# Altium schematic symbol library WR-TBL_Pluggable PCB Header.SchLib: 719 symbols (part 5 of 5)
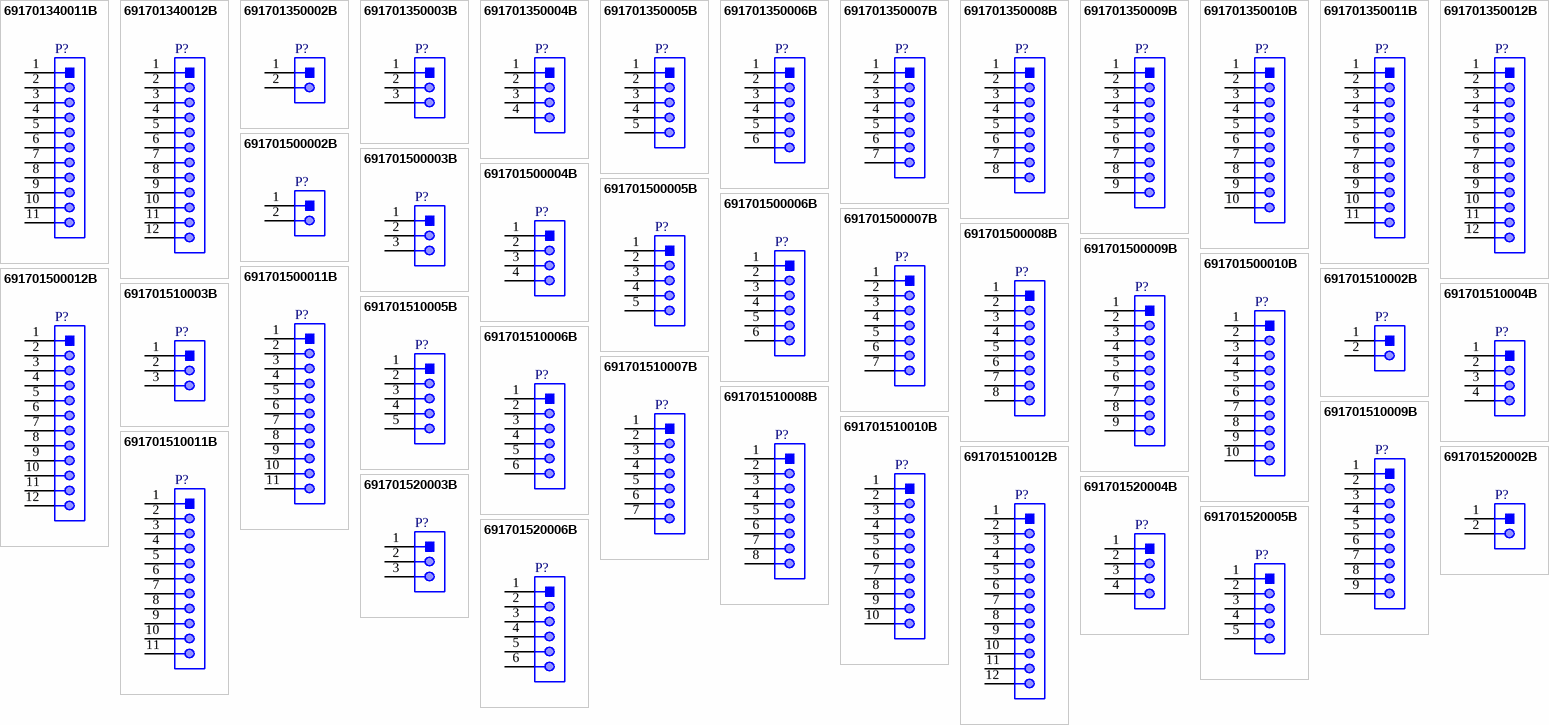
[diagram p21: symbols 691701340011B to 691701520006B]

## 691701510003B
designator P?
WR-TBL Serie 7015B Close Vertical PCB Header THR Type, Pluggable, pitch 5.08mm, 3p; Part Number: 691701510003B; Compliance: RoHS; Modularity: No; Pin Number: 3; Rated Current [UL]: 10A; Working Voltage [UL]: 300VAC; ComponentLink1Description: Manufacturer; ComponentLink1URL: http://www.we-online.de; ComponentLink2URL: https://katalog.we-online.de/em/datasheet/691701510003B.pdf; ComponentLink2Description: Datasheet; Mounting Technology: THR; Packaging: Box; Operating Temperature: -40 to +105degC; PCB/Cable/Panel: PCB; Pitch: 5.08mm; Published Date: October 2019; Type: Vertical; Publisher: Wurth Elektronik; Application: Pluggable
footprint 691701510003B
pins: 1, 2, 3

## 691701510004B
designator P?
WR-TBL Serie 7015B Close Vertical PCB Header THR Type, Pluggable, pitch 5.08mm, 4p; Part Number: 691701510004B; Compliance: RoHS; Modularity: No; Pin Number: 4; Rated Current [UL]: 10A; Working Voltage [UL]: 300VAC; ComponentLink1Description: Manufacturer; ComponentLink1URL: http://www.we-online.de; ComponentLink2URL: https://katalog.we-online.de/em/datasheet/691701510004B.pdf; ComponentLink2Description: Datasheet; Mounting Technology: THR; Packaging: Box; Operating Temperature: -40 to +105degC; PCB/Cable/Panel: PCB; Pitch: 5.08mm; Published Date: October 2019; Type: Vertical; Publisher: Wurth Elektronik; Application: Pluggable
footprint 691701510004B
pins: 1, 2, 3, 4

## 691701510005B
designator P?
WR-TBL Serie 7015B Close Vertical PCB Header THR Type, Pluggable, pitch 5.08mm, 5p; Part Number: 691701510005B; Compliance: RoHS; Modularity: No; Pin Number: 5; Rated Current [UL]: 10A; Working Voltage [UL]: 300VAC; ComponentLink1Description: Manufacturer; ComponentLink1URL: http://www.we-online.de; ComponentLink2URL: https://katalog.we-online.de/em/datasheet/691701510005B.pdf; ComponentLink2Description: Datasheet; Mounting Technology: THR; Packaging: Box; Operating Temperature: -40 to +105degC; PCB/Cable/Panel: PCB; Pitch: 5.08mm; Published Date: October 2019; Type: Vertical; Publisher: Wurth Elektronik; Application: Pluggable
footprint 691701510005B
pins: 1, 2, 3, 4, 5

## 691701510006B
designator P?
WR-TBL Serie 7015B Close Vertical PCB Header THR Type, Pluggable, pitch 5.08mm, 6p; Part Number: 691701510006B; Compliance: RoHS; Modularity: No; Pin Number: 6; Rated Current [UL]: 10A; Working Voltage [UL]: 300VAC; ComponentLink1Description: Manufacturer; ComponentLink1URL: http://www.we-online.de; ComponentLink2URL: https://katalog.we-online.de/em/datasheet/691701510006B.pdf; ComponentLink2Description: Datasheet; Mounting Technology: THR; Packaging: Box; Operating Temperature: -40 to +105degC; PCB/Cable/Panel: PCB; Pitch: 5.08mm; Published Date: October 2019; Type: Vertical; Publisher: Wurth Elektronik; Application: Pluggable
footprint 691701510006B
pins: 1, 2, 3, 4, 5, 6

## 691701510007B
designator P?
WR-TBL Serie 7015B Close Vertical PCB Header THR Type, Pluggable, pitch 5.08mm, 7p; Part Number: 691701510007B; Compliance: RoHS; Modularity: No; Pin Number: 7; Rated Current [UL]: 10A; Working Voltage [UL]: 300VAC; ComponentLink1Description: Manufacturer; ComponentLink1URL: http://www.we-online.de; ComponentLink2URL: https://katalog.we-online.de/em/datasheet/691701510007B.pdf; ComponentLink2Description: Datasheet; Mounting Technology: THR; Packaging: Box; Operating Temperature: -40 to +105degC; PCB/Cable/Panel: PCB; Pitch: 5.08mm; Published Date: October 2019; Type: Vertical; Publisher: Wurth Elektronik; Application: Pluggable
footprint 691701510007B
pins: 1, 2, 3, 4, 5, 6, 7

## 691701510008B
designator P?
WR-TBL Serie 7015B Close Vertical PCB Header THR Type, Pluggable, pitch 5.08mm, 8p; Part Number: 691701510008B; Compliance: RoHS; Modularity: No; Pin Number: 8; Rated Current [UL]: 10A; Working Voltage [UL]: 300VAC; ComponentLink1Description: Manufacturer; ComponentLink1URL: http://www.we-online.de; ComponentLink2URL: https://katalog.we-online.de/em/datasheet/691701510008B.pdf; ComponentLink2Description: Datasheet; Mounting Technology: THR; Packaging: Box; Operating Temperature: -40 to +105degC; PCB/Cable/Panel: PCB; Pitch: 5.08mm; Published Date: October 2019; Type: Vertical; Publisher: Wurth Elektronik; Application: Pluggable
footprint 691701510008B
pins: 1, 2, 3, 4, 5, 6, 7, 8

## 691701510009B
designator P?
WR-TBL Serie 7015B Close Vertical PCB Header THR Type, Pluggable, pitch 5.08mm, 9p; Part Number: 691701510009B; Compliance: RoHS; Modularity: No; Pin Number: 9; Rated Current [UL]: 10A; Working Voltage [UL]: 300VAC; ComponentLink1Description: Manufacturer; ComponentLink1URL: http://www.we-online.de; ComponentLink2URL: https://katalog.we-online.de/em/datasheet/691701510009B.pdf; ComponentLink2Description: Datasheet; Mounting Technology: THR; Packaging: Box; Operating Temperature: -40 to +105degC; PCB/Cable/Panel: PCB; Pitch: 5.08mm; Published Date: October 2019; Type: Vertical; Publisher: Wurth Elektronik; Application: Pluggable
footprint 691701510009B
pins: 1, 2, 3, 4, 5, 6, 7, 8, 9

## 691701510010B
designator P?
WR-TBL Serie 7015B Close Vertical PCB Header THR Type, Pluggable, pitch 5.08mm, 10p; Part Number: 691701510010B; Compliance: RoHS; Modularity: No; Pin Number: 10; Rated Current [UL]: 10A; Working Voltage [UL]: 300VAC; ComponentLink1Description: Manufacturer; ComponentLink1URL: http://www.we-online.de; ComponentLink2URL: https://katalog.we-online.de/em/datasheet/691701510010B.pdf; ComponentLink2Description: Datasheet; Mounting Technology: THR; Packaging: Box; Operating Temperature: -40 to +105degC; PCB/Cable/Panel: PCB; Pitch: 5.08mm; Published Date: October 2019; Type: Vertical; Publisher: Wurth Elektronik; Application: Pluggable
footprint 691701510010B
pins: 1, 2, 3, 4, 5, 6, 7, 8, 9, 10

## 691701510011B
designator P?
WR-TBL Serie 7015B Close Vertical PCB Header THR Type, Pluggable, pitch 5.08mm, 11p; Part Number: 691701510011B; Compliance: RoHS; Modularity: No; Pin Number: 11; Rated Current [UL]: 10A; Working Voltage [UL]: 300VAC; ComponentLink1Description: Manufacturer; ComponentLink1URL: http://www.we-online.de; ComponentLink2URL: https://katalog.we-online.de/em/datasheet/691701510011B.pdf; ComponentLink2Description: Datasheet; Mounting Technology: THR; Packaging: Box; Operating Temperature: -40 to +105degC; PCB/Cable/Panel: PCB; Pitch: 5.08mm; Published Date: October 2019; Type: Vertical; Publisher: Wurth Elektronik; Application: Pluggable
footprint 691701510011B
pins: 1, 2, 3, 4, 5, 6, 7, 8, 9, 10, 11

## 691701510012B
designator P?
WR-TBL Serie 7015B Close Vertical PCB Header THR Type, Pluggable, pitch 5.08mm, 12p; Part Number: 691701510012B; Compliance: RoHS; Modularity: No; Pin Number: 12; Rated Current [UL]: 10A; Working Voltage [UL]: 300VAC; ComponentLink1Description: Manufacturer; ComponentLink1URL: http://www.we-online.de; ComponentLink2URL: https://katalog.we-online.de/em/datasheet/691701510012B.pdf; ComponentLink2Description: Datasheet; Mounting Technology: THR; Packaging: Box; Operating Temperature: -40 to +105degC; PCB/Cable/Panel: PCB; Pitch: 5.08mm; Published Date: October 2019; Type: Vertical; Publisher: Wurth Elektronik; Application: Pluggable
footprint 691701510012B
pins: 1, 2, 3, 4, 5, 6, 7, 8, 9, 10, 11, 12

## 691701520002B
designator P?
WR-TBL Serie 7015B Close Vertical PCB Header THR Type with Flanges, Pluggable, pitch 5.08mm, 2p; Part Number: 691701520002B; Compliance: RoHS; Modularity: No; Pin Number: 2; Rated Current [UL]: 10A; Working Voltage [UL]: 300VAC; ComponentLink1Description: Manufacturer; ComponentLink1URL: http://www.we-online.de; ComponentLink2URL: https://katalog.we-online.de/em/datasheet/691701520002B.pdf; ComponentLink2Description: Datasheet; Mounting Technology: THR; Packaging: Box; Operating Temperature: -40 to +105degC; PCB/Cable/Panel: PCB; Pitch: 5.08mm; Published Date: October 2019; Type: Vertical; Publisher: Wurth Elektronik; Application: Pluggable
footprint 691701520002B
pins: 1, 2

## 691701520003B
designator P?
WR-TBL Serie 7015B Close Vertical PCB Header THR Type with Flanges, Pluggable, pitch 5.08mm, 3p; Part Number: 691701520003B; Compliance: RoHS; Modularity: No; Pin Number: 3; Rated Current [UL]: 10A; Working Voltage [UL]: 300VAC; ComponentLink1Description: Manufacturer; ComponentLink1URL: http://www.we-online.de; ComponentLink2URL: https://katalog.we-online.de/em/datasheet/691701520003B.pdf; ComponentLink2Description: Datasheet; Mounting Technology: THR; Packaging: Box; Operating Temperature: -40 to +105degC; PCB/Cable/Panel: PCB; Pitch: 5.08mm; Published Date: October 2019; Type: Vertical; Publisher: Wurth Elektronik; Application: Pluggable
footprint 691701520003B
pins: 1, 2, 3

## 691701520004B
designator P?
WR-TBL Serie 7015B Close Vertical PCB Header THR Type with Flanges, Pluggable, pitch 5.08mm, 4p; Part Number: 691701520004B; Compliance: RoHS; Modularity: No; Pin Number: 4; Rated Current [UL]: 10A; Working Voltage [UL]: 300VAC; ComponentLink1Description: Manufacturer; ComponentLink1URL: http://www.we-online.de; ComponentLink2URL: https://katalog.we-online.de/em/datasheet/691701520004B.pdf; ComponentLink2Description: Datasheet; Mounting Technology: THR; Packaging: Box; Operating Temperature: -40 to +105degC; PCB/Cable/Panel: PCB; Pitch: 5.08mm; Published Date: October 2019; Type: Vertical; Publisher: Wurth Elektronik; Application: Pluggable
footprint 691701520004B
pins: 1, 2, 3, 4

## 691701520005B
designator P?
WR-TBL Serie 7015B Close Vertical PCB Header THR Type with Flanges, Pluggable, pitch 5.08mm, 5p; Part Number: 691701520005B; Compliance: RoHS; Modularity: No; Pin Number: 5; Rated Current [UL]: 10A; Working Voltage [UL]: 300VAC; ComponentLink1Description: Manufacturer; ComponentLink1URL: http://www.we-online.de; ComponentLink2URL: https://katalog.we-online.de/em/datasheet/691701520005B.pdf; ComponentLink2Description: Datasheet; Mounting Technology: THR; Packaging: Box; Operating Temperature: -40 to +105degC; PCB/Cable/Panel: PCB; Pitch: 5.08mm; Published Date: October 2019; Type: Vertical; Publisher: Wurth Elektronik; Application: Pluggable
footprint 691701520005B
pins: 1, 2, 3, 4, 5

## 691701520006B
designator P?
WR-TBL Serie 7015B Close Vertical PCB Header THR Type with Flanges, Pluggable, pitch 5.08mm, 6p; Part Number: 691701520006B; Compliance: RoHS; Modularity: No; Pin Number: 6; Rated Current [UL]: 10A; Working Voltage [UL]: 300VAC; ComponentLink1Description: Manufacturer; ComponentLink1URL: http://www.we-online.de; ComponentLink2URL: https://katalog.we-online.de/em/datasheet/691701520006B.pdf; ComponentLink2Description: Datasheet; Mounting Technology: THR; Packaging: Box; Operating Temperature: -40 to +105degC; PCB/Cable/Panel: PCB; Pitch: 5.08mm; Published Date: October 2019; Type: Vertical; Publisher: Wurth Elektronik; Application: Pluggable
footprint 691701520006B
pins: 1, 2, 3, 4, 5, 6

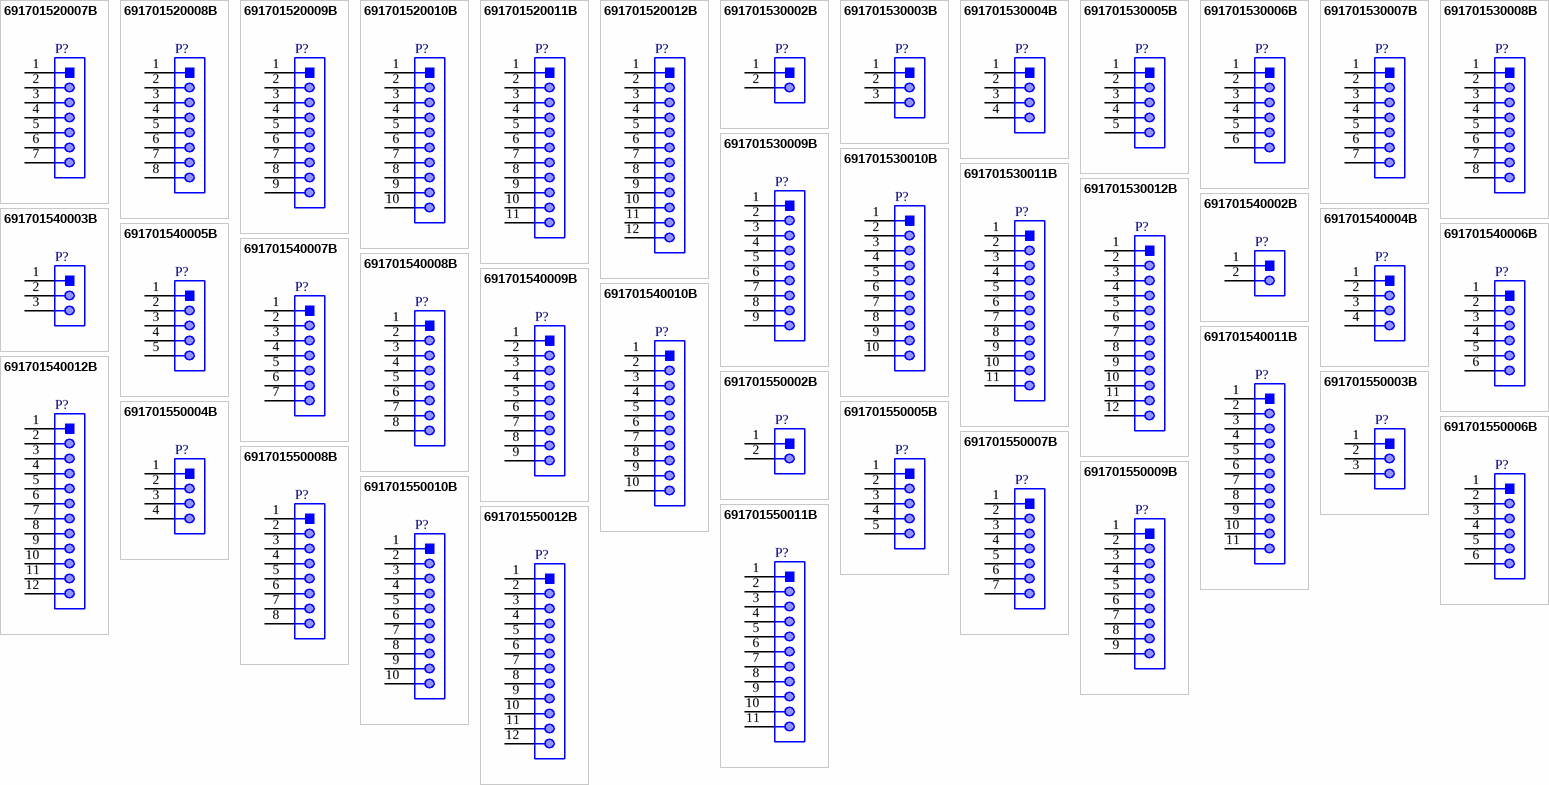
[diagram p17: symbols 691701520007B to 691701550012B]

## 691701520007B
designator P?
WR-TBL Serie 7015B Close Vertical PCB Header THR Type with Flanges, Pluggable, pitch 5.08mm, 7p; Part Number: 691701520007B; Compliance: RoHS; Modularity: No; Pin Number: 7; Rated Current [UL]: 10A; Working Voltage [UL]: 300VAC; ComponentLink1Description: Manufacturer; ComponentLink1URL: http://www.we-online.de; ComponentLink2URL: https://katalog.we-online.de/em/datasheet/691701520007B.pdf; ComponentLink2Description: Datasheet; Mounting Technology: THR; Packaging: Box; Operating Temperature: -40 to +105degC; PCB/Cable/Panel: PCB; Pitch: 5.08mm; Published Date: October 2019; Type: Vertical; Publisher: Wurth Elektronik; Application: Pluggable
footprint 691701520007B
pins: 1, 2, 3, 4, 5, 6, 7

## 691701520008B
designator P?
WR-TBL Serie 7015B Close Vertical PCB Header THR Type with Flanges, Pluggable, pitch 5.08mm, 8p; Part Number: 691701520008B; Compliance: RoHS; Modularity: No; Pin Number: 8; Rated Current [UL]: 10A; Working Voltage [UL]: 300VAC; ComponentLink1Description: Manufacturer; ComponentLink1URL: http://www.we-online.de; ComponentLink2URL: https://katalog.we-online.de/em/datasheet/691701520008B.pdf; ComponentLink2Description: Datasheet; Mounting Technology: THR; Packaging: Box; Operating Temperature: -40 to +105degC; PCB/Cable/Panel: PCB; Pitch: 5.08mm; Published Date: October 2019; Type: Vertical; Publisher: Wurth Elektronik; Application: Pluggable
footprint 691701520008B
pins: 1, 2, 3, 4, 5, 6, 7, 8

## 691701520009B
designator P?
WR-TBL Serie 7015B Close Vertical PCB Header THR Type with Flanges, Pluggable, pitch 5.08mm, 9p; Part Number: 691701520009B; Compliance: RoHS; Modularity: No; Pin Number: 9; Rated Current [UL]: 10A; Working Voltage [UL]: 300VAC; ComponentLink1Description: Manufacturer; ComponentLink1URL: http://www.we-online.de; ComponentLink2URL: https://katalog.we-online.de/em/datasheet/691701520009B.pdf; ComponentLink2Description: Datasheet; Mounting Technology: THR; Packaging: Box; Operating Temperature: -40 to +105degC; PCB/Cable/Panel: PCB; Pitch: 5.08mm; Published Date: October 2019; Type: Vertical; Publisher: Wurth Elektronik; Application: Pluggable
footprint 691701520009B
pins: 1, 2, 3, 4, 5, 6, 7, 8, 9

## 691701520010B
designator P?
WR-TBL Serie 7015B Close Vertical PCB Header THR Type with Flanges, Pluggable, pitch 5.08mm, 10p; Part Number: 691701520010B; Compliance: RoHS; Modularity: No; Pin Number: 10; Rated Current [UL]: 10A; Working Voltage [UL]: 300VAC; ComponentLink1Description: Manufacturer; ComponentLink1URL: http://www.we-online.de; ComponentLink2URL: https://katalog.we-online.de/em/datasheet/691701520010B.pdf; ComponentLink2Description: Datasheet; Mounting Technology: THR; Packaging: Box; Operating Temperature: -40 to +105degC; PCB/Cable/Panel: PCB; Pitch: 5.08mm; Published Date: October 2019; Type: Vertical; Publisher: Wurth Elektronik; Application: Pluggable
footprint 691701520010B
pins: 1, 2, 3, 4, 5, 6, 7, 8, 9, 10

## 691701520011B
designator P?
WR-TBL Serie 7015B Close Vertical PCB Header THR Type with Flanges, Pluggable, pitch 5.08mm, 11p; Part Number: 691701520011B; Compliance: RoHS; Modularity: No; Pin Number: 11; Rated Current [UL]: 10A; Working Voltage [UL]: 300VAC; ComponentLink1Description: Manufacturer; ComponentLink1URL: http://www.we-online.de; ComponentLink2URL: https://katalog.we-online.de/em/datasheet/691701520011B.pdf; ComponentLink2Description: Datasheet; Mounting Technology: THR; Packaging: Box; Operating Temperature: -40 to +105degC; PCB/Cable/Panel: PCB; Pitch: 5.08mm; Published Date: October 2019; Type: Vertical; Publisher: Wurth Elektronik; Application: Pluggable
footprint 691701520011B
pins: 1, 2, 3, 4, 5, 6, 7, 8, 9, 10, 11

## 691701520012B
designator P?
WR-TBL Serie 7015B Close Vertical PCB Header THR Type with Flanges, Pluggable, pitch 5.08mm, 12p; Part Number: 691701520012B; Compliance: RoHS; Modularity: No; Pin Number: 12; Rated Current [UL]: 10A; Working Voltage [UL]: 300VAC; ComponentLink1Description: Manufacturer; ComponentLink1URL: http://www.we-online.de; ComponentLink2URL: https://katalog.we-online.de/em/datasheet/691701520012B.pdf; ComponentLink2Description: Datasheet; Mounting Technology: THR; Packaging: Box; Operating Temperature: -40 to +105degC; PCB/Cable/Panel: PCB; Pitch: 5.08mm; Published Date: October 2019; Type: Vertical; Publisher: Wurth Elektronik; Application: Pluggable
footprint 691701520012B
pins: 1, 2, 3, 4, 5, 6, 7, 8, 9, 10, 11, 12

## 691701530002B
designator P?
WR-TBL Serie 7015B Open Horizontal PCB Header THR Type, Pluggable, pitch 5.08mm, 2p; Part Number: 691701530002B; Compliance: RoHS; Modularity: No; Pin Number: 2; Rated Current [UL]: 10A; Working Voltage [UL]: 300VAC; ComponentLink1Description: Manufacturer; ComponentLink1URL: http://www.we-online.de; ComponentLink2URL: https://katalog.we-online.de/em/datasheet/691701530002B.pdf; ComponentLink2Description: Datasheet; Mounting Technology: THR; Packaging: Box; Operating Temperature: -40 to +105degC; PCB/Cable/Panel: PCB; Pitch: 5.08mm; Published Date: October 2019; Type: Horizontal; Publisher: Wurth Elektronik; Application: Pluggable
footprint 691701530002B
pins: 1, 2

## 691701530003B
designator P?
WR-TBL Serie 7015B Open Horizontal PCB Header THR Type, Pluggable, pitch 5.08mm, 3p; Part Number: 691701530003B; Compliance: RoHS; Modularity: No; Pin Number: 3; Rated Current [UL]: 10A; Working Voltage [UL]: 300VAC; ComponentLink1Description: Manufacturer; ComponentLink1URL: http://www.we-online.de; ComponentLink2URL: https://katalog.we-online.de/em/datasheet/691701530003B.pdf; ComponentLink2Description: Datasheet; Mounting Technology: THR; Packaging: Box; Operating Temperature: -40 to +105degC; PCB/Cable/Panel: PCB; Pitch: 5.08mm; Published Date: October 2019; Type: Horizontal; Publisher: Wurth Elektronik; Application: Pluggable
footprint 691701530003B
pins: 1, 2, 3

## 691701530004B
designator P?
WR-TBL Serie 7015B Open Horizontal PCB Header THR Type, Pluggable, pitch 5.08mm, 4p; Part Number: 691701530004B; Compliance: RoHS; Modularity: No; Pin Number: 4; Rated Current [UL]: 10A; Working Voltage [UL]: 300VAC; ComponentLink1Description: Manufacturer; ComponentLink1URL: http://www.we-online.de; ComponentLink2URL: https://katalog.we-online.de/em/datasheet/691701530004B.pdf; ComponentLink2Description: Datasheet; Mounting Technology: THR; Packaging: Box; Operating Temperature: -40 to +105degC; PCB/Cable/Panel: PCB; Pitch: 5.08mm; Published Date: October 2019; Type: Horizontal; Publisher: Wurth Elektronik; Application: Pluggable
footprint 691701530004B
pins: 1, 2, 3, 4

## 691701530005B
designator P?
WR-TBL Serie 7015B Open Horizontal PCB Header THR Type, Pluggable, pitch 5.08mm, 5p; Part Number: 691701530005B; Compliance: RoHS; Modularity: No; Pin Number: 5; Rated Current [UL]: 10A; Working Voltage [UL]: 300VAC; ComponentLink1Description: Manufacturer; ComponentLink1URL: http://www.we-online.de; ComponentLink2URL: https://katalog.we-online.de/em/datasheet/691701530005B.pdf; ComponentLink2Description: Datasheet; Mounting Technology: THR; Packaging: Box; Operating Temperature: -40 to +105degC; PCB/Cable/Panel: PCB; Pitch: 5.08mm; Published Date: October 2019; Type: Horizontal; Publisher: Wurth Elektronik; Application: Pluggable
footprint 691701530005B
pins: 1, 2, 3, 4, 5

## 691701530006B
designator P?
WR-TBL Serie 7015B Open Horizontal PCB Header THR Type, Pluggable, pitch 5.08mm, 6p; Part Number: 691701530006B; Compliance: RoHS; Modularity: No; Pin Number: 6; Rated Current [UL]: 10A; Working Voltage [UL]: 300VAC; ComponentLink1Description: Manufacturer; ComponentLink1URL: http://www.we-online.de; ComponentLink2URL: https://katalog.we-online.de/em/datasheet/691701530006B.pdf; ComponentLink2Description: Datasheet; Mounting Technology: THR; Packaging: Box; Operating Temperature: -40 to +105degC; PCB/Cable/Panel: PCB; Pitch: 5.08mm; Published Date: October 2019; Type: Horizontal; Publisher: Wurth Elektronik; Application: Pluggable
footprint 691701530006B
pins: 1, 2, 3, 4, 5, 6

## 691701530007B
designator P?
WR-TBL Serie 7015B Open Horizontal PCB Header THR Type, Pluggable, pitch 5.08mm, 7p; Part Number: 691701530007B; Compliance: RoHS; Modularity: No; Pin Number: 7; Rated Current [UL]: 10A; Working Voltage [UL]: 300VAC; ComponentLink1Description: Manufacturer; ComponentLink1URL: http://www.we-online.de; ComponentLink2URL: https://katalog.we-online.de/em/datasheet/691701530007B.pdf; ComponentLink2Description: Datasheet; Mounting Technology: THR; Packaging: Box; Operating Temperature: -40 to +105degC; PCB/Cable/Panel: PCB; Pitch: 5.08mm; Published Date: October 2019; Type: Horizontal; Publisher: Wurth Elektronik; Application: Pluggable
footprint 691701530007B
pins: 1, 2, 3, 4, 5, 6, 7

## 691701530008B
designator P?
WR-TBL Serie 7015B Open Horizontal PCB Header THR Type, Pluggable, pitch 5.08mm, 8p; Part Number: 691701530008B; Compliance: RoHS; Modularity: No; Pin Number: 8; Rated Current [UL]: 10A; Working Voltage [UL]: 300VAC; ComponentLink1Description: Manufacturer; ComponentLink1URL: http://www.we-online.de; ComponentLink2URL: https://katalog.we-online.de/em/datasheet/691701530008B.pdf; ComponentLink2Description: Datasheet; Mounting Technology: THR; Packaging: Box; Operating Temperature: -40 to +105degC; PCB/Cable/Panel: PCB; Pitch: 5.08mm; Published Date: October 2019; Type: Horizontal; Publisher: Wurth Elektronik; Application: Pluggable
footprint 691701530008B
pins: 1, 2, 3, 4, 5, 6, 7, 8

## 691701530009B
designator P?
WR-TBL Serie 7015B Open Horizontal PCB Header THR Type, Pluggable, pitch 5.08mm, 9p; Part Number: 691701530009B; Compliance: RoHS; Modularity: No; Pin Number: 9; Rated Current [UL]: 10A; Working Voltage [UL]: 300VAC; ComponentLink1Description: Manufacturer; ComponentLink1URL: http://www.we-online.de; ComponentLink2URL: https://katalog.we-online.de/em/datasheet/691701530009B.pdf; ComponentLink2Description: Datasheet; Mounting Technology: THR; Packaging: Box; Operating Temperature: -40 to +105degC; PCB/Cable/Panel: PCB; Pitch: 5.08mm; Published Date: October 2019; Type: Horizontal; Publisher: Wurth Elektronik; Application: Pluggable
footprint 691701530009B
pins: 1, 2, 3, 4, 5, 6, 7, 8, 9

## 691701530010B
designator P?
WR-TBL Serie 7015B Open Horizontal PCB Header THR Type, Pluggable, pitch 5.08mm, 10p; Part Number: 691701530010B; Compliance: RoHS; Modularity: No; Pin Number: 10; Rated Current [UL]: 10A; Working Voltage [UL]: 300VAC; ComponentLink1Description: Manufacturer; ComponentLink1URL: http://www.we-online.de; ComponentLink2URL: https://katalog.we-online.de/em/datasheet/691701530010B.pdf; ComponentLink2Description: Datasheet; Mounting Technology: THR; Packaging: Box; Operating Temperature: -40 to +105degC; PCB/Cable/Panel: PCB; Pitch: 5.08mm; Published Date: October 2019; Type: Horizontal; Publisher: Wurth Elektronik; Application: Pluggable
footprint 691701530010B
pins: 1, 2, 3, 4, 5, 6, 7, 8, 9, 10

## 691701530011B
designator P?
WR-TBL Serie 7015B Open Horizontal PCB Header THR Type, Pluggable, pitch 5.08mm, 11p; Part Number: 691701530011B; Compliance: RoHS; Modularity: No; Pin Number: 11; Rated Current [UL]: 10A; Working Voltage [UL]: 300VAC; ComponentLink1Description: Manufacturer; ComponentLink1URL: http://www.we-online.de; ComponentLink2URL: https://katalog.we-online.de/em/datasheet/691701530011B.pdf; ComponentLink2Description: Datasheet; Mounting Technology: THR; Packaging: Box; Operating Temperature: -40 to +105degC; PCB/Cable/Panel: PCB; Pitch: 5.08mm; Published Date: October 2019; Type: Horizontal; Publisher: Wurth Elektronik; Application: Pluggable
footprint 691701530011B
pins: 1, 2, 3, 4, 5, 6, 7, 8, 9, 10, 11

## 691701530012B
designator P?
WR-TBL Serie 7015B Open Horizontal PCB Header THR Type, Pluggable, pitch 5.08mm, 12p; Part Number: 691701530012B; Compliance: RoHS; Modularity: No; Pin Number: 12; Rated Current [UL]: 10A; Working Voltage [UL]: 300VAC; ComponentLink1Description: Manufacturer; ComponentLink1URL: http://www.we-online.de; ComponentLink2URL: https://katalog.we-online.de/em/datasheet/691701530012B.pdf; ComponentLink2Description: Datasheet; Mounting Technology: THR; Packaging: Box; Operating Temperature: -40 to +105degC; PCB/Cable/Panel: PCB; Pitch: 5.08mm; Published Date: October 2019; Type: Horizontal; Publisher: Wurth Elektronik; Application: Pluggable
footprint 691701530012B
pins: 1, 2, 3, 4, 5, 6, 7, 8, 9, 10, 11, 12

## 691701540002B
designator P?
WR-TBL Serie 7015B Close Horizontal PCB Header THR Type, Pluggable, pitch 5.08mm, 2p; Part Number: 691701540002B; Compliance: RoHS; Modularity: No; Pin Number: 2; Rated Current [UL]: 10A; Working Voltage [UL]: 300VAC; ComponentLink1Description: Manufacturer; ComponentLink1URL: http://www.we-online.de; ComponentLink2URL: https://katalog.we-online.de/em/datasheet/691701540002B.pdf; ComponentLink2Description: Datasheet; Mounting Technology: THR; Packaging: Box; Operating Temperature: -40 to +105degC; PCB/Cable/Panel: PCB; Pitch: 5.08mm; Published Date: October 2019; Type: Horizontal; Publisher: Wurth Elektronik; Application: Pluggable
footprint 691701540002B
pins: 1, 2

## 691701540003B
designator P?
WR-TBL Serie 7015B Close Horizontal PCB Header THR Type, Pluggable, pitch 5.08mm, 3p; Part Number: 691701540003B; Compliance: RoHS; Modularity: No; Pin Number: 3; Rated Current [UL]: 10A; Working Voltage [UL]: 300VAC; ComponentLink1Description: Manufacturer; ComponentLink1URL: http://www.we-online.de; ComponentLink2URL: https://katalog.we-online.de/em/datasheet/691701540003B.pdf; ComponentLink2Description: Datasheet; Mounting Technology: THR; Packaging: Box; Operating Temperature: -40 to +105degC; PCB/Cable/Panel: PCB; Pitch: 5.08mm; Published Date: October 2019; Type: Horizontal; Publisher: Wurth Elektronik; Application: Pluggable
footprint 691701540003B
pins: 1, 2, 3

## 691701540004B
designator P?
WR-TBL Serie 7015B Close Horizontal PCB Header THR Type, Pluggable, pitch 5.08mm, 4p; Part Number: 691701540004B; Compliance: RoHS; Modularity: No; Pin Number: 4; Rated Current [UL]: 10A; Working Voltage [UL]: 300VAC; ComponentLink1Description: Manufacturer; ComponentLink1URL: http://www.we-online.de; ComponentLink2URL: https://katalog.we-online.de/em/datasheet/691701540004B.pdf; ComponentLink2Description: Datasheet; Mounting Technology: THR; Packaging: Box; Operating Temperature: -40 to +105degC; PCB/Cable/Panel: PCB; Pitch: 5.08mm; Published Date: October 2019; Type: Horizontal; Publisher: Wurth Elektronik; Application: Pluggable
footprint 691701540004B
pins: 1, 2, 3, 4

## 691701540005B
designator P?
WR-TBL Serie 7015B Close Horizontal PCB Header THR Type, Pluggable, pitch 5.08mm, 5p; Part Number: 691701540005B; Compliance: RoHS; Modularity: No; Pin Number: 5; Rated Current [UL]: 10A; Working Voltage [UL]: 300VAC; ComponentLink1Description: Manufacturer; ComponentLink1URL: http://www.we-online.de; ComponentLink2URL: https://katalog.we-online.de/em/datasheet/691701540005B.pdf; ComponentLink2Description: Datasheet; Mounting Technology: THR; Packaging: Box; Operating Temperature: -40 to +105degC; PCB/Cable/Panel: PCB; Pitch: 5.08mm; Published Date: October 2019; Type: Horizontal; Publisher: Wurth Elektronik; Application: Pluggable
footprint 691701540005B
pins: 1, 2, 3, 4, 5

## 691701540006B
designator P?
WR-TBL Serie 7015B Close Horizontal PCB Header THR Type, Pluggable, pitch 5.08mm, 6p; Part Number: 691701540006B; Compliance: RoHS; Modularity: No; Pin Number: 6; Rated Current [UL]: 10A; Working Voltage [UL]: 300VAC; ComponentLink1Description: Manufacturer; ComponentLink1URL: http://www.we-online.de; ComponentLink2URL: https://katalog.we-online.de/em/datasheet/691701540006B.pdf; ComponentLink2Description: Datasheet; Mounting Technology: THR; Packaging: Box; Operating Temperature: -40 to +105degC; PCB/Cable/Panel: PCB; Pitch: 5.08mm; Published Date: October 2019; Type: Horizontal; Publisher: Wurth Elektronik; Application: Pluggable
footprint 691701540006B
pins: 1, 2, 3, 4, 5, 6

## 691701540007B
designator P?
WR-TBL Serie 7015B Close Horizontal PCB Header THR Type, Pluggable, pitch 5.08mm, 7p; Part Number: 691701540007B; Compliance: RoHS; Modularity: No; Pin Number: 7; Rated Current [UL]: 10A; Working Voltage [UL]: 300VAC; ComponentLink1Description: Manufacturer; ComponentLink1URL: http://www.we-online.de; ComponentLink2URL: https://katalog.we-online.de/em/datasheet/691701540007B.pdf; ComponentLink2Description: Datasheet; Mounting Technology: THR; Packaging: Box; Operating Temperature: -40 to +105degC; PCB/Cable/Panel: PCB; Pitch: 5.08mm; Published Date: October 2019; Type: Horizontal; Publisher: Wurth Elektronik; Application: Pluggable
footprint 691701540007B
pins: 1, 2, 3, 4, 5, 6, 7

## 691701540008B
designator P?
WR-TBL Serie 7015B Close Horizontal PCB Header THR Type, Pluggable, pitch 5.08mm, 8p; Part Number: 691701540008B; Compliance: RoHS; Modularity: No; Pin Number: 8; Rated Current [UL]: 10A; Working Voltage [UL]: 300VAC; ComponentLink1Description: Manufacturer; ComponentLink1URL: http://www.we-online.de; ComponentLink2URL: https://katalog.we-online.de/em/datasheet/691701540008B.pdf; ComponentLink2Description: Datasheet; Mounting Technology: THR; Packaging: Box; Operating Temperature: -40 to +105degC; PCB/Cable/Panel: PCB; Pitch: 5.08mm; Published Date: October 2019; Type: Horizontal; Publisher: Wurth Elektronik; Application: Pluggable
footprint 691701540008B
pins: 1, 2, 3, 4, 5, 6, 7, 8

## 691701540009B
designator P?
WR-TBL Serie 7015B Close Horizontal PCB Header THR Type, Pluggable, pitch 5.08mm, 9p; Part Number: 691701540009B; Compliance: RoHS; Modularity: No; Pin Number: 9; Rated Current [UL]: 10A; Working Voltage [UL]: 300VAC; ComponentLink1Description: Manufacturer; ComponentLink1URL: http://www.we-online.de; ComponentLink2URL: https://katalog.we-online.de/em/datasheet/691701540009B.pdf; ComponentLink2Description: Datasheet; Mounting Technology: THR; Packaging: Box; Operating Temperature: -40 to +105degC; PCB/Cable/Panel: PCB; Pitch: 5.08mm; Published Date: October 2019; Type: Horizontal; Publisher: Wurth Elektronik; Application: Pluggable
footprint 691701540009B
pins: 1, 2, 3, 4, 5, 6, 7, 8, 9

## 691701540010B
designator P?
WR-TBL Serie 7015B Close Horizontal PCB Header THR Type, Pluggable, pitch 5.08mm, 10p; Part Number: 691701540010B; Compliance: RoHS; Modularity: No; Pin Number: 10; Rated Current [UL]: 10A; Working Voltage [UL]: 300VAC; ComponentLink1Description: Manufacturer; ComponentLink1URL: http://www.we-online.de; ComponentLink2URL: https://katalog.we-online.de/em/datasheet/691701540010B.pdf; ComponentLink2Description: Datasheet; Mounting Technology: THR; Packaging: Box; Operating Temperature: -40 to +105degC; PCB/Cable/Panel: PCB; Pitch: 5.08mm; Published Date: October 2019; Type: Horizontal; Publisher: Wurth Elektronik; Application: Pluggable
footprint 691701540010B
pins: 1, 2, 3, 4, 5, 6, 7, 8, 9, 10

## 691701540011B
designator P?
WR-TBL Serie 7015B Close Horizontal PCB Header THR Type, Pluggable, pitch 5.08mm, 11p; Part Number: 691701540011B; Compliance: RoHS; Modularity: No; Pin Number: 11; Rated Current [UL]: 10A; Working Voltage [UL]: 300VAC; ComponentLink1Description: Manufacturer; ComponentLink1URL: http://www.we-online.de; ComponentLink2URL: https://katalog.we-online.de/em/datasheet/691701540011B.pdf; ComponentLink2Description: Datasheet; Mounting Technology: THR; Packaging: Box; Operating Temperature: -40 to +105degC; PCB/Cable/Panel: PCB; Pitch: 5.08mm; Published Date: October 2019; Type: Horizontal; Publisher: Wurth Elektronik; Application: Pluggable
footprint 691701540011B
pins: 1, 2, 3, 4, 5, 6, 7, 8, 9, 10, 11

## 691701540012B
designator P?
WR-TBL Serie 7015B Close Horizontal PCB Header THR Type, Pluggable, pitch 5.08mm, 12p; Part Number: 691701540012B; Compliance: RoHS; Modularity: No; Pin Number: 12; Rated Current [UL]: 10A; Working Voltage [UL]: 300VAC; ComponentLink1Description: Manufacturer; ComponentLink1URL: http://www.we-online.de; ComponentLink2URL: https://katalog.we-online.de/em/datasheet/691701540012B.pdf; ComponentLink2Description: Datasheet; Mounting Technology: THR; Packaging: Box; Operating Temperature: -40 to +105degC; PCB/Cable/Panel: PCB; Pitch: 5.08mm; Published Date: October 2019; Type: Horizontal; Publisher: Wurth Elektronik; Application: Pluggable
footprint 691701540012B
pins: 1, 2, 3, 4, 5, 6, 7, 8, 9, 10, 11, 12

## 691701550002B
designator P?
WR-TBL Serie 7015B Closed Horizontal PCB Header THR Type with Flanges, Pluggable, pitch 5.08mm, 2p; Part Number: 691701550002B; Compliance: RoHS; Modularity: No; Pin Number: 2; Rated Current [UL]: 10A; Working Voltage [UL]: 300VAC; ComponentLink1Description: Manufacturer; ComponentLink1URL: http://www.we-online.de; ComponentLink2URL: https://katalog.we-online.de/em/datasheet/691701550002B.pdf; ComponentLink2Description: Datasheet; Mounting Technology: THR; Packaging: Box; Operating Temperature: -40 to +105degC; PCB/Cable/Panel: PCB; Pitch: 5.08mm; Published Date: October 2019; Type: Horizontal; Publisher: Wurth Elektronik; Application: Pluggable
footprint 691701550002B
pins: 1, 2

## 691701550003B
designator P?
WR-TBL Serie 7015B Closed Horizontal PCB Header THR Type with Flanges, Pluggable, pitch 5.08mm, 3p; Part Number: 691701550003B; Compliance: RoHS; Modularity: No; Pin Number: 3; Rated Current [UL]: 10A; Working Voltage [UL]: 300VAC; ComponentLink1Description: Manufacturer; ComponentLink1URL: http://www.we-online.de; ComponentLink2URL: https://katalog.we-online.de/em/datasheet/691701550003B.pdf; ComponentLink2Description: Datasheet; Mounting Technology: THR; Packaging: Box; Operating Temperature: -40 to +105degC; PCB/Cable/Panel: PCB; Pitch: 5.08mm; Published Date: October 2019; Type: Horizontal; Publisher: Wurth Elektronik; Application: Pluggable
footprint 691701550003B
pins: 1, 2, 3

## 691701550004B
designator P?
WR-TBL Serie 7015B Closed Horizontal PCB Header THR Type with Flanges, Pluggable, pitch 5.08mm, 4p; Part Number: 691701550004B; Compliance: RoHS; Modularity: No; Pin Number: 4; Rated Current [UL]: 10A; Working Voltage [UL]: 300VAC; ComponentLink1Description: Manufacturer; ComponentLink1URL: http://www.we-online.de; ComponentLink2URL: https://katalog.we-online.de/em/datasheet/691701550004B.pdf; ComponentLink2Description: Datasheet; Mounting Technology: THR; Packaging: Box; Operating Temperature: -40 to +105degC; PCB/Cable/Panel: PCB; Pitch: 5.08mm; Published Date: October 2019; Type: Horizontal; Publisher: Wurth Elektronik; Application: Pluggable
footprint 691701550004B
pins: 1, 2, 3, 4

## 691701550005B
designator P?
WR-TBL Serie 7015B Closed Horizontal PCB Header THR Type with Flanges, Pluggable, pitch 5.08mm, 5p; Part Number: 691701550005B; Compliance: RoHS; Modularity: No; Pin Number: 5; Rated Current [UL]: 10A; Working Voltage [UL]: 300VAC; ComponentLink1Description: Manufacturer; ComponentLink1URL: http://www.we-online.de; ComponentLink2URL: https://katalog.we-online.de/em/datasheet/691701550005B.pdf; ComponentLink2Description: Datasheet; Mounting Technology: THR; Packaging: Box; Operating Temperature: -40 to +105degC; PCB/Cable/Panel: PCB; Pitch: 5.08mm; Published Date: October 2019; Type: Horizontal; Publisher: Wurth Elektronik; Application: Pluggable
footprint 691701550005B
pins: 1, 2, 3, 4, 5

## 691701550006B
designator P?
WR-TBL Serie 7015B Closed Horizontal PCB Header THR Type with Flanges, Pluggable, pitch 5.08mm, 6p; Part Number: 691701550006B; Compliance: RoHS; Modularity: No; Pin Number: 6; Rated Current [UL]: 10A; Working Voltage [UL]: 300VAC; ComponentLink1Description: Manufacturer; ComponentLink1URL: http://www.we-online.de; ComponentLink2URL: https://katalog.we-online.de/em/datasheet/691701550006B.pdf; ComponentLink2Description: Datasheet; Mounting Technology: THR; Packaging: Box; Operating Temperature: -40 to +105degC; PCB/Cable/Panel: PCB; Pitch: 5.08mm; Published Date: October 2019; Type: Horizontal; Publisher: Wurth Elektronik; Application: Pluggable
footprint 691701550006B
pins: 1, 2, 3, 4, 5, 6

## 691701550007B
designator P?
WR-TBL Serie 7015B Closed Horizontal PCB Header THR Type with Flanges, Pluggable, pitch 5.08mm, 7p; Part Number: 691701550007B; Compliance: RoHS; Modularity: No; Pin Number: 7; Rated Current [UL]: 10A; Working Voltage [UL]: 300VAC; ComponentLink1Description: Manufacturer; ComponentLink1URL: http://www.we-online.de; ComponentLink2URL: https://katalog.we-online.de/em/datasheet/691701550007B.pdf; ComponentLink2Description: Datasheet; Mounting Technology: THR; Packaging: Box; Operating Temperature: -40 to +105degC; PCB/Cable/Panel: PCB; Pitch: 5.08mm; Published Date: October 2019; Type: Horizontal; Publisher: Wurth Elektronik; Application: Pluggable
footprint 691701550007B
pins: 1, 2, 3, 4, 5, 6, 7

## 691701550008B
designator P?
WR-TBL Serie 7015B Closed Horizontal PCB Header THR Type with Flanges, Pluggable, pitch 5.08mm, 8p; Part Number: 691701550008B; Compliance: RoHS; Modularity: No; Pin Number: 8; Rated Current [UL]: 10A; Working Voltage [UL]: 300VAC; ComponentLink1Description: Manufacturer; ComponentLink1URL: http://www.we-online.de; ComponentLink2URL: https://katalog.we-online.de/em/datasheet/691701550008B.pdf; ComponentLink2Description: Datasheet; Mounting Technology: THR; Packaging: Box; Operating Temperature: -40 to +105degC; PCB/Cable/Panel: PCB; Pitch: 5.08mm; Published Date: October 2019; Type: Horizontal; Publisher: Wurth Elektronik; Application: Pluggable
footprint 691701550008B
pins: 1, 2, 3, 4, 5, 6, 7, 8

## 691701550009B
designator P?
WR-TBL Serie 7015B Closed Horizontal PCB Header THR Type with Flanges, Pluggable, pitch 5.08mm, 9p; Part Number: 691701550009B; Compliance: RoHS; Modularity: No; Pin Number: 9; Rated Current [UL]: 10A; Working Voltage [UL]: 300VAC; ComponentLink1Description: Manufacturer; ComponentLink1URL: http://www.we-online.de; ComponentLink2URL: https://katalog.we-online.de/em/datasheet/691701550009B.pdf; ComponentLink2Description: Datasheet; Mounting Technology: THR; Packaging: Box; Operating Temperature: -40 to +105degC; PCB/Cable/Panel: PCB; Pitch: 5.08mm; Published Date: October 2019; Type: Horizontal; Publisher: Wurth Elektronik; Application: Pluggable
footprint 691701550009B
pins: 1, 2, 3, 4, 5, 6, 7, 8, 9

## 691701550010B
designator P?
WR-TBL Serie 7015B Closed Horizontal PCB Header THR Type with Flanges, Pluggable, pitch 5.08mm, 10p; Part Number: 691701550010B; Compliance: RoHS; Modularity: No; Pin Number: 10; Rated Current [UL]: 10A; Working Voltage [UL]: 300VAC; ComponentLink1Description: Manufacturer; ComponentLink1URL: http://www.we-online.de; ComponentLink2URL: https://katalog.we-online.de/em/datasheet/691701550010B.pdf; ComponentLink2Description: Datasheet; Mounting Technology: THR; Packaging: Box; Operating Temperature: -40 to +105degC; PCB/Cable/Panel: PCB; Pitch: 5.08mm; Published Date: October 2019; Type: Horizontal; Publisher: Wurth Elektronik; Application: Pluggable
footprint 691701550010B
pins: 1, 2, 3, 4, 5, 6, 7, 8, 9, 10

## 691701550011B
designator P?
WR-TBL Serie 7015B Closed Horizontal PCB Header THR Type with Flanges, Pluggable, pitch 5.08mm, 11p; Part Number: 691701550011B; Compliance: RoHS; Modularity: No; Pin Number: 11; Rated Current [UL]: 10A; Working Voltage [UL]: 300VAC; ComponentLink1Description: Manufacturer; ComponentLink1URL: http://www.we-online.de; ComponentLink2URL: https://katalog.we-online.de/em/datasheet/691701550011B.pdf; ComponentLink2Description: Datasheet; Mounting Technology: THR; Packaging: Box; Operating Temperature: -40 to +105degC; PCB/Cable/Panel: PCB; Pitch: 5.08mm; Published Date: October 2019; Type: Horizontal; Publisher: Wurth Elektronik; Application: Pluggable
footprint 691701550011B
pins: 1, 2, 3, 4, 5, 6, 7, 8, 9, 10, 11

## 691701550012B
designator P?
WR-TBL Serie 7015B Closed Horizontal PCB Header THR Type with Flanges, Pluggable, pitch 5.08mm, 12p; Part Number: 691701550012B; Compliance: RoHS; Modularity: No; Pin Number: 12; Rated Current [UL]: 10A; Working Voltage [UL]: 300VAC; ComponentLink1Description: Manufacturer; ComponentLink1URL: http://www.we-online.de; ComponentLink2URL: https://katalog.we-online.de/em/datasheet/691701550012B.pdf; ComponentLink2Description: Datasheet; Mounting Technology: THR; Packaging: Box; Operating Temperature: -40 to +105degC; PCB/Cable/Panel: PCB; Pitch: 5.08mm; Published Date: October 2019; Type: Horizontal; Publisher: Wurth Elektronik; Application: Pluggable
footprint 691701550012B
pins: 1, 2, 3, 4, 5, 6, 7, 8, 9, 10, 11, 12